# Altium schematic symbol library Regulator_Linear.SchLib: 1452 symbols (part 3 of 10)
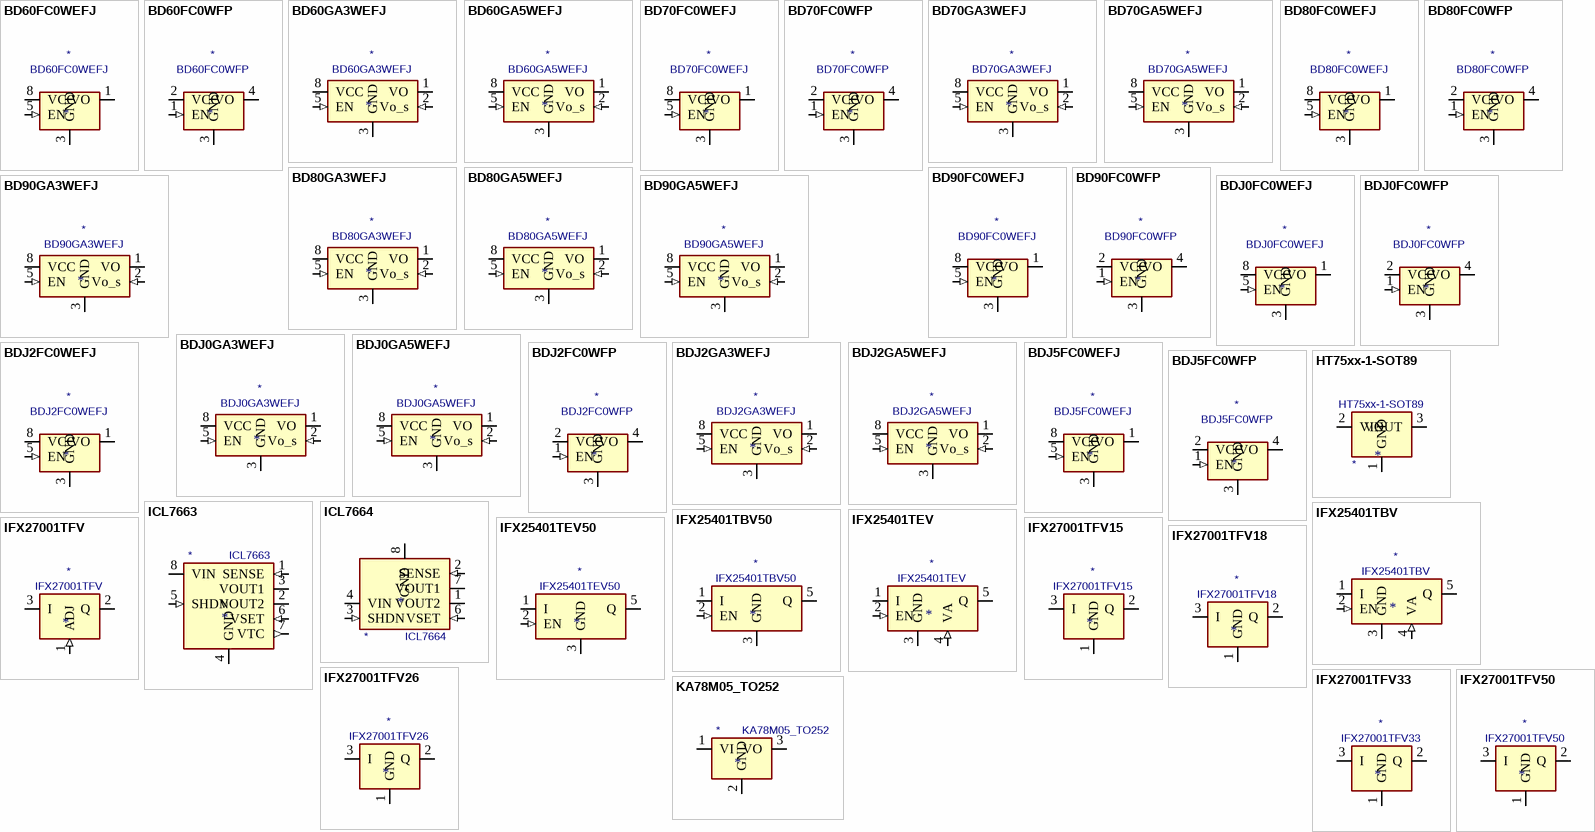
[diagram p38: symbols BD60FC0WEFJ to KA78M05_TO252]

## ICL7664
designator *  value ICL7664
ki_keywords: Linear Regulator 50mA -5V fixed negative; ki_description: 50mA Dual Mode -5V/Programmable Negative Voltage Regulator, DIP-8/SO-8/TO-99; ki_fp_filters: DIP*W7.62mm* SOIC*3.9x4.9mm*P1.27mm* TO?99*; Supplier: http://pe2bz.philpem.me.uk/pdf%20on%20typenumber/I-L/ICL7664.pdf
pins: 1 VOUT2 (power), 2 SENSE (in), 3 SHDN (in), 4 VIN (power), 5 SHDN (in) hidden, 6 VSET (in), 7 VOUT1 (power), 8 GND (power)

## IFX25401TBV
designator *  value IFX25401TBV
ki_keywords: adjustable LDO positive voltage regulator; ki_description: Adjustable LDO Linear Voltage Regulator (TO-263-5); ki_fp_filters: TO?263*TabPin3*; Footprint: Package_TO_SOT_SMD:TO-263-5_TabPin3; Supplier: https://www.infineon.com/dgdl/Infineon-IFX25401-DS-v01_02-en.pdf?fileId=db3a304320d39d590120f62a690569f7
footprint TO-263-5_TabPin3
pins: 1 I (power), 2 EN (in), 3 GND (power), 4 VA (in), 5 Q (power)

## IFX25401TBV50
designator *  value IFX25401TBV50
ki_keywords: fixed ldo positive voltage regulator; ki_description: Fixed 5V LDO Linear Voltage Regulator (TO-263-5); ki_fp_filters: TO?263*TabPin3*; Footprint: Package_TO_SOT_SMD:TO-263-5_TabPin3; Supplier: https://www.infineon.com/dgdl/Infineon-IFX25401-DS-v01_02-en.pdf?fileId=db3a304320d39d590120f62a690569f7
footprint TO-263-5_TabPin3
pins: 1 I (power), 2 EN (in), 3 GND (power), 4 NC (in) hidden, 5 Q (power)

## IFX25401TEV
designator *  value IFX25401TEV
ki_keywords: adjustable LDO positive voltage regulator; ki_description: Adjustable LDO Linear Voltage Regulator (TO-252-4); ki_fp_filters: TO*252*; Footprint: Package_TO_SOT_SMD:TO-252-4; Supplier: https://www.infineon.com/dgdl/Infineon-IFX25401-DS-v01_02-en.pdf?fileId=db3a304320d39d590120f62a690569f7
footprint TO-252-4
pins: 1 I (power), 2 EN (in), 3 GND (power), 4 VA (in), 5 Q (power)

## IFX25401TEV50
designator *  value IFX25401TEV50
ki_keywords: fixed ldo positive voltage regulator; ki_description: Fixed 5V LDO Linear Voltage Regulator (TO-252-4); ki_fp_filters: TO*252*; Footprint: Package_TO_SOT_SMD:TO-252-4; Supplier: https://www.infineon.com/dgdl/Infineon-IFX25401-DS-v01_02-en.pdf?fileId=db3a304320d39d590120f62a690569f7
footprint TO-252-4
pins: 1 I (power), 2 EN (in), 3 GND (power), 4 NC (in) hidden, 5 Q (power)

## IFX27001TFV
designator *  value IFX27001TFV
ki_keywords: LDO positive voltage industrial; ki_description: 1A Low Dropout Regulator, positive, adjustable output, TO-252-3; ki_fp_filters: TO?252*; Footprint: Package_TO_SOT_SMD:TO-252-3_TabPin2; Supplier: https://static6.arrow.com/aropdfconversion/dc75757ae45a88e5f69bdce3f2a651a5fe0ca07d/ifx27001_ds_10.pdf
footprint TO-252-3_TabPin2
pins: 1 ADJ (in), 2 Q (power), 3 I (power)

## IFX27001TFV15
designator *  value IFX27001TFV15
ki_keywords: LDO positive voltage industrial; ki_description: 1A Low Dropout Regulator, positive, 1.5V fixed output, TO-252-3; ki_fp_filters: TO?252*; Footprint: Package_TO_SOT_SMD:TO-252-3_TabPin2; Supplier: https://static6.arrow.com/aropdfconversion/dc75757ae45a88e5f69bdce3f2a651a5fe0ca07d/ifx27001_ds_10.pdf
footprint TO-252-3_TabPin2
pins: 1 GND (power), 2 Q (power), 3 I (power)

## IFX27001TFV18
designator *  value IFX27001TFV18
ki_keywords: LDO positive voltage industrial; ki_description: 1A Low Dropout Regulator, positive, 1.8V fixed output, TO-252-3; ki_fp_filters: TO?252*; Footprint: Package_TO_SOT_SMD:TO-252-3_TabPin2; Supplier: https://static6.arrow.com/aropdfconversion/dc75757ae45a88e5f69bdce3f2a651a5fe0ca07d/ifx27001_ds_10.pdf
footprint TO-252-3_TabPin2
pins: 1 GND (power), 2 Q (power), 3 I (power)

## IFX27001TFV26
designator *  value IFX27001TFV26
ki_keywords: LDO positive voltage industrial; ki_description: 1A Low Dropout Regulator, positive, 2.6V fixed output, TO-252-3; ki_fp_filters: TO?252*; Footprint: Package_TO_SOT_SMD:TO-252-3_TabPin2; Supplier: https://static6.arrow.com/aropdfconversion/dc75757ae45a88e5f69bdce3f2a651a5fe0ca07d/ifx27001_ds_10.pdf
footprint TO-252-3_TabPin2
pins: 1 GND (power), 2 Q (power), 3 I (power)

## IFX27001TFV33
designator *  value IFX27001TFV33
ki_keywords: LDO positive voltage industrial; ki_description: 1A Low Dropout Regulator, positive, 3.3V fixed output, TO-252-3; ki_fp_filters: TO?252*; Footprint: Package_TO_SOT_SMD:TO-252-3_TabPin2; Supplier: https://static6.arrow.com/aropdfconversion/dc75757ae45a88e5f69bdce3f2a651a5fe0ca07d/ifx27001_ds_10.pdf
footprint TO-252-3_TabPin2
pins: 1 GND (power), 2 Q (power), 3 I (power)

## IFX27001TFV50
designator *  value IFX27001TFV50
ki_keywords: LDO positive voltage industrial; ki_description: 1A Low Dropout Regulator, positive, 5.0V fixed output, TO-252-3; ki_fp_filters: TO?252*; Footprint: Package_TO_SOT_SMD:TO-252-3_TabPin2; Supplier: https://static6.arrow.com/aropdfconversion/dc75757ae45a88e5f69bdce3f2a651a5fe0ca07d/ifx27001_ds_10.pdf
footprint TO-252-3_TabPin2
pins: 1 GND (power), 2 Q (power), 3 I (power)

## KA78M05_TO252
designator *  value KA78M05_TO252
ki_keywords: Voltage Regulator 500mA Positive; ki_description: Positive 500mA 35V Linear Regulator, Fixed Output 5V, TO-252 (D-PAK); ki_fp_filters: TO?252*; Footprint: Package_TO_SOT_SMD:TO-252-2; Supplier: https://www.onsemi.com/pub/Collateral/MC78M00-D.PDF
footprint TO-252-2
pins: 1 VI (power), 2 GND (power), 3 VO (power)

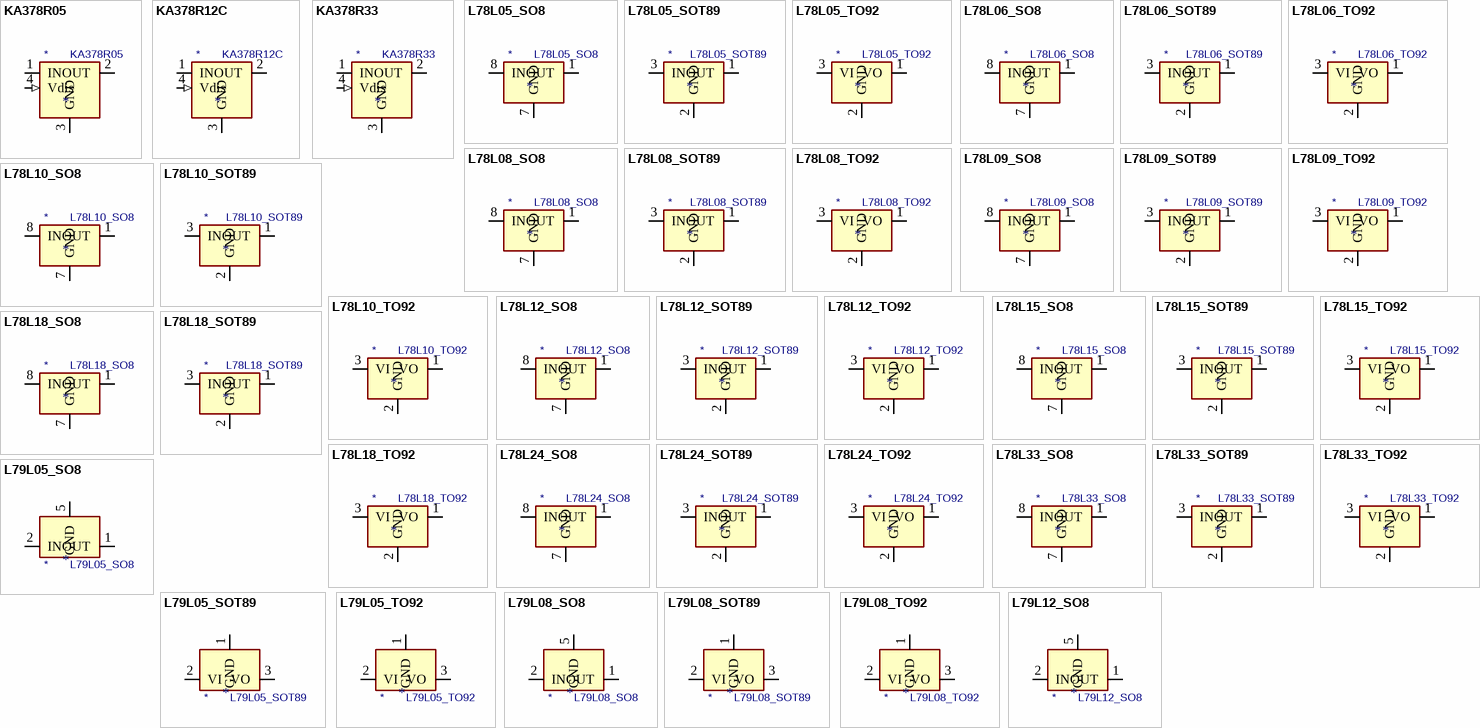
[diagram p8: symbols KA378R05 to L79L12_SO8]

## KA378R05
designator *  value KA378R05
ki_keywords: Voltage Regulator 3A Positive LDO Disable Pin; ki_description: Positive 3A 35V Linear Regulator with Disable Pin, LDO, Fixed Output 5V, TO-220F-4L; ki_fp_filters: TO?220*; Footprint: Package_TO_SOT_THT:TO-220-4_Vertical; Supplier: https://www.onsemi.com/pub/Collateral/KA378R05-D.pdf
footprint TO-220-4_Vertical
pins: 1 IN (power), 2 OUT (power), 3 GND (power), 4 Vdis (in)

## KA378R12C
designator *  value KA378R12C
ki_keywords: Voltage Regulator 3A Positive LDO Disable Pin; ki_description: Positive 3A 35V Linear Regulator with Disable Pin, LDO, Fixed Output 12V, TO-220F-4L; ki_fp_filters: TO?220*; Footprint: Package_TO_SOT_THT:TO-220-4_Vertical; Supplier: https://www.onsemi.com/pub/Collateral/KA378R12CTU-D.pdf
footprint TO-220-4_Vertical
pins: 1 IN (power), 2 OUT (power), 3 GND (power), 4 Vdis (in)

## KA378R33
designator *  value KA378R33
ki_keywords: Voltage Regulator 3A Positive LDO Disable Pin; ki_description: Positive 3A 35V Linear Regulator with Disable Pin, LDO, Fixed Output 3.3V, TO-220F-4L; ki_fp_filters: TO?220*; Footprint: Package_TO_SOT_THT:TO-220-4_Vertical; Supplier: https://www.onsemi.com/pub/Collateral/KA378R33-D.pdf
footprint TO-220-4_Vertical
pins: 1 IN (power), 2 OUT (power), 3 GND (power), 4 Vdis (in)

## L78L05_SO8
designator *  value L78L05_SO8
ki_keywords: Voltage Regulator 100mA Positive; ki_description: Positive 100mA 30V Linear Regulator, Fixed Output 5V, SO-8; ki_fp_filters: SOIC*3.9x4.9mm*P1.27mm*; Footprint: Package_SO:SOIC-8_3.9x4.9mm_P1.27mm; Supplier: http://www.st.com/content/ccc/resource/technical/document/datasheet/15/55/e5/aa/23/5b/43/fd/CD00000446.pdf/files/CD00000446.pdf/jcr:content/translations/en.CD00000446.pdf
footprint SOIC-8_3.9x4.9mm_P1.27mm
pins: 1 OUT (power), 2 GND hidden, 3 GND hidden, 4 NC (in) hidden, 5 NC (in) hidden, 6 GND hidden, 7 GND (power), 8 IN (power)

## L78L05_SOT89
designator *  value L78L05_SOT89
ki_keywords: Voltage Regulator 100mA Positive; ki_description: Positive 100mA 30V Linear Regulator, Fixed Output 5V, SOT-89; ki_fp_filters: SOT?89*; Footprint: Package_TO_SOT_SMD:SOT-89-3; Supplier: http://www.st.com/content/ccc/resource/technical/document/datasheet/15/55/e5/aa/23/5b/43/fd/CD00000446.pdf/files/CD00000446.pdf/jcr:content/translations/en.CD00000446.pdf
footprint SOT-89-3
pins: 1 OUT (power), 2 GND (power), 3 IN (power)

## L78L05_TO92
designator *  value L78L05_TO92
ki_keywords: Voltage Regulator 100mA Positive; ki_description: Positive 100mA 30V Linear Regulator, Fixed Output 5V, TO-92; ki_fp_filters: TO?92*; Footprint: Package_TO_SOT_THT:TO-92_Inline; Supplier: http://www.st.com/content/ccc/resource/technical/document/datasheet/15/55/e5/aa/23/5b/43/fd/CD00000446.pdf/files/CD00000446.pdf/jcr:content/translations/en.CD00000446.pdf
footprint TO-92_Inline
pins: 1 VO (power), 2 GND (power), 3 VI (power)

## L78L06_SO8
designator *  value L78L06_SO8
ki_keywords: Voltage Regulator 100mA Positive; ki_description: Positive 100mA 30V Linear Regulator, Fixed Output 6V, SO-8; ki_fp_filters: SOIC*3.9x4.9mm*P1.27mm*; Footprint: Package_SO:SOIC-8_3.9x4.9mm_P1.27mm; Supplier: http://www.st.com/content/ccc/resource/technical/document/datasheet/15/55/e5/aa/23/5b/43/fd/CD00000446.pdf/files/CD00000446.pdf/jcr:content/translations/en.CD00000446.pdf
footprint SOIC-8_3.9x4.9mm_P1.27mm
pins: 1 OUT (power), 2 GND hidden, 3 GND hidden, 4 NC (in) hidden, 5 NC (in) hidden, 6 GND hidden, 7 GND (power), 8 IN (power)

## L78L06_SOT89
designator *  value L78L06_SOT89
ki_keywords: Voltage Regulator 100mA Positive; ki_description: Positive 100mA 30V Linear Regulator, Fixed Output 6V, SOT-89; ki_fp_filters: SOT?89*; Footprint: Package_TO_SOT_SMD:SOT-89-3; Supplier: http://www.st.com/content/ccc/resource/technical/document/datasheet/15/55/e5/aa/23/5b/43/fd/CD00000446.pdf/files/CD00000446.pdf/jcr:content/translations/en.CD00000446.pdf
footprint SOT-89-3
pins: 1 OUT (power), 2 GND (power), 3 IN (power)

## L78L06_TO92
designator *  value L78L06_TO92
ki_keywords: Voltage Regulator 100mA Positive; ki_description: Positive 100mA 30V Linear Regulator, Fixed Output 6V, TO-92; ki_fp_filters: TO?92*; Footprint: Package_TO_SOT_THT:TO-92_Inline; Supplier: http://www.st.com/content/ccc/resource/technical/document/datasheet/15/55/e5/aa/23/5b/43/fd/CD00000446.pdf/files/CD00000446.pdf/jcr:content/translations/en.CD00000446.pdf
footprint TO-92_Inline
pins: 1 VO (power), 2 GND (power), 3 VI (power)

## L78L08_SO8
designator *  value L78L08_SO8
ki_keywords: Voltage Regulator 100mA Positive; ki_description: Positive 100mA 30V Linear Regulator, Fixed Output 8V, SO-8; ki_fp_filters: SOIC*3.9x4.9mm*P1.27mm*; Footprint: Package_SO:SOIC-8_3.9x4.9mm_P1.27mm; Supplier: http://www.st.com/content/ccc/resource/technical/document/datasheet/15/55/e5/aa/23/5b/43/fd/CD00000446.pdf/files/CD00000446.pdf/jcr:content/translations/en.CD00000446.pdf
footprint SOIC-8_3.9x4.9mm_P1.27mm
pins: 1 OUT (power), 2 GND hidden, 3 GND hidden, 4 NC (in) hidden, 5 NC (in) hidden, 6 GND hidden, 7 GND (power), 8 IN (power)

## L78L08_SOT89
designator *  value L78L08_SOT89
ki_keywords: Voltage Regulator 100mA Positive; ki_description: Positive 100mA 30V Linear Regulator, Fixed Output 8V, SOT-89; ki_fp_filters: SOT?89*; Footprint: Package_TO_SOT_SMD:SOT-89-3; Supplier: http://www.st.com/content/ccc/resource/technical/document/datasheet/15/55/e5/aa/23/5b/43/fd/CD00000446.pdf/files/CD00000446.pdf/jcr:content/translations/en.CD00000446.pdf
footprint SOT-89-3
pins: 1 OUT (power), 2 GND (power), 3 IN (power)

## L78L08_TO92
designator *  value L78L08_TO92
ki_keywords: Voltage Regulator 100mA Positive; ki_description: Positive 100mA 30V Linear Regulator, Fixed Output 8V, TO-92; ki_fp_filters: TO?92*; Footprint: Package_TO_SOT_THT:TO-92_Inline; Supplier: http://www.st.com/content/ccc/resource/technical/document/datasheet/15/55/e5/aa/23/5b/43/fd/CD00000446.pdf/files/CD00000446.pdf/jcr:content/translations/en.CD00000446.pdf
footprint TO-92_Inline
pins: 1 VO (power), 2 GND (power), 3 VI (power)

## L78L09_SO8
designator *  value L78L09_SO8
ki_keywords: Voltage Regulator 100mA Positive; ki_description: Positive 100mA 30V Linear Regulator, Fixed Output 9V, SO-8; ki_fp_filters: SOIC*3.9x4.9mm*P1.27mm*; Footprint: Package_SO:SOIC-8_3.9x4.9mm_P1.27mm; Supplier: http://www.st.com/content/ccc/resource/technical/document/datasheet/15/55/e5/aa/23/5b/43/fd/CD00000446.pdf/files/CD00000446.pdf/jcr:content/translations/en.CD00000446.pdf
footprint SOIC-8_3.9x4.9mm_P1.27mm
pins: 1 OUT (power), 2 GND hidden, 3 GND hidden, 4 NC (in) hidden, 5 NC (in) hidden, 6 GND hidden, 7 GND (power), 8 IN (power)

## L78L09_SOT89
designator *  value L78L09_SOT89
ki_keywords: Voltage Regulator 100mA Positive; ki_description: Positive 100mA 30V Linear Regulator, Fixed Output 9V, SOT-89; ki_fp_filters: SOT?89*; Footprint: Package_TO_SOT_SMD:SOT-89-3; Supplier: http://www.st.com/content/ccc/resource/technical/document/datasheet/15/55/e5/aa/23/5b/43/fd/CD00000446.pdf/files/CD00000446.pdf/jcr:content/translations/en.CD00000446.pdf
footprint SOT-89-3
pins: 1 OUT (power), 2 GND (power), 3 IN (power)

## L78L09_TO92
designator *  value L78L09_TO92
ki_keywords: Voltage Regulator 100mA Positive; ki_description: Positive 100mA 30V Linear Regulator, Fixed Output 9V, TO-92; ki_fp_filters: TO?92*; Footprint: Package_TO_SOT_THT:TO-92_Inline; Supplier: http://www.st.com/content/ccc/resource/technical/document/datasheet/15/55/e5/aa/23/5b/43/fd/CD00000446.pdf/files/CD00000446.pdf/jcr:content/translations/en.CD00000446.pdf
footprint TO-92_Inline
pins: 1 VO (power), 2 GND (power), 3 VI (power)

## L78L10_SO8
designator *  value L78L10_SO8
ki_keywords: Voltage Regulator 100mA Positive; ki_description: Positive 100mA 30V Linear Regulator, Fixed Output 10V, SO-8; ki_fp_filters: SOIC*3.9x4.9mm*P1.27mm*; Footprint: Package_SO:SOIC-8_3.9x4.9mm_P1.27mm; Supplier: http://www.st.com/content/ccc/resource/technical/document/datasheet/15/55/e5/aa/23/5b/43/fd/CD00000446.pdf/files/CD00000446.pdf/jcr:content/translations/en.CD00000446.pdf
footprint SOIC-8_3.9x4.9mm_P1.27mm
pins: 1 OUT (power), 2 GND hidden, 3 GND hidden, 4 NC (in) hidden, 5 NC (in) hidden, 6 GND hidden, 7 GND (power), 8 IN (power)

## L78L10_SOT89
designator *  value L78L10_SOT89
ki_keywords: Voltage Regulator 100mA Positive; ki_description: Positive 100mA 30V Linear Regulator, Fixed Output 10V, SOT-89; ki_fp_filters: SOT?89*; Footprint: Package_TO_SOT_SMD:SOT-89-3; Supplier: http://www.st.com/content/ccc/resource/technical/document/datasheet/15/55/e5/aa/23/5b/43/fd/CD00000446.pdf/files/CD00000446.pdf/jcr:content/translations/en.CD00000446.pdf
footprint SOT-89-3
pins: 1 OUT (power), 2 GND (power), 3 IN (power)

## L78L10_TO92
designator *  value L78L10_TO92
ki_keywords: Voltage Regulator 100mA Positive; ki_description: Positive 100mA 30V Linear Regulator, Fixed Output 10V, TO-92; ki_fp_filters: TO?92*; Footprint: Package_TO_SOT_THT:TO-92_Inline; Supplier: http://www.st.com/content/ccc/resource/technical/document/datasheet/15/55/e5/aa/23/5b/43/fd/CD00000446.pdf/files/CD00000446.pdf/jcr:content/translations/en.CD00000446.pdf
footprint TO-92_Inline
pins: 1 VO (power), 2 GND (power), 3 VI (power)

## L78L12_SO8
designator *  value L78L12_SO8
ki_keywords: Voltage Regulator 100mA Positive; ki_description: Positive 100mA 30V Linear Regulator, Fixed Output 12V, SO-8; ki_fp_filters: SOIC*3.9x4.9mm*P1.27mm*; Footprint: Package_SO:SOIC-8_3.9x4.9mm_P1.27mm; Supplier: http://www.st.com/content/ccc/resource/technical/document/datasheet/15/55/e5/aa/23/5b/43/fd/CD00000446.pdf/files/CD00000446.pdf/jcr:content/translations/en.CD00000446.pdf
footprint SOIC-8_3.9x4.9mm_P1.27mm
pins: 1 OUT (power), 2 GND hidden, 3 GND hidden, 4 NC (in) hidden, 5 NC (in) hidden, 6 GND hidden, 7 GND (power), 8 IN (power)

## L78L12_SOT89
designator *  value L78L12_SOT89
ki_keywords: Voltage Regulator 100mA Positive; ki_description: Positive 100mA 30V Linear Regulator, Fixed Output 12V, SOT-89; ki_fp_filters: SOT?89*; Footprint: Package_TO_SOT_SMD:SOT-89-3; Supplier: http://www.st.com/content/ccc/resource/technical/document/datasheet/15/55/e5/aa/23/5b/43/fd/CD00000446.pdf/files/CD00000446.pdf/jcr:content/translations/en.CD00000446.pdf
footprint SOT-89-3
pins: 1 OUT (power), 2 GND (power), 3 IN (power)

## L78L12_TO92
designator *  value L78L12_TO92
ki_keywords: Voltage Regulator 100mA Positive; ki_description: Positive 100mA 30V Linear Regulator, Fixed Output 12V, TO-92; ki_fp_filters: TO?92*; Footprint: Package_TO_SOT_THT:TO-92_Inline; Supplier: http://www.st.com/content/ccc/resource/technical/document/datasheet/15/55/e5/aa/23/5b/43/fd/CD00000446.pdf/files/CD00000446.pdf/jcr:content/translations/en.CD00000446.pdf
footprint TO-92_Inline
pins: 1 VO (power), 2 GND (power), 3 VI (power)

## L78L15_SO8
designator *  value L78L15_SO8
ki_keywords: Voltage Regulator 100mA Positive; ki_description: Positive 100mA 30V Linear Regulator, Fixed Output 15V, SO-8; ki_fp_filters: SOIC*3.9x4.9mm*P1.27mm*; Footprint: Package_SO:SOIC-8_3.9x4.9mm_P1.27mm; Supplier: http://www.st.com/content/ccc/resource/technical/document/datasheet/15/55/e5/aa/23/5b/43/fd/CD00000446.pdf/files/CD00000446.pdf/jcr:content/translations/en.CD00000446.pdf
footprint SOIC-8_3.9x4.9mm_P1.27mm
pins: 1 OUT (power), 2 GND hidden, 3 GND hidden, 4 NC (in) hidden, 5 NC (in) hidden, 6 GND hidden, 7 GND (power), 8 IN (power)

## L78L15_SOT89
designator *  value L78L15_SOT89
ki_keywords: Voltage Regulator 100mA Positive; ki_description: Positive 100mA 30V Linear Regulator, Fixed Output 15V, SOT-89; ki_fp_filters: SOT?89*; Footprint: Package_TO_SOT_SMD:SOT-89-3; Supplier: http://www.st.com/content/ccc/resource/technical/document/datasheet/15/55/e5/aa/23/5b/43/fd/CD00000446.pdf/files/CD00000446.pdf/jcr:content/translations/en.CD00000446.pdf
footprint SOT-89-3
pins: 1 OUT (power), 2 GND (power), 3 IN (power)

## L78L15_TO92
designator *  value L78L15_TO92
ki_keywords: Voltage Regulator 100mA Positive; ki_description: Positive 100mA 30V Linear Regulator, Fixed Output 15V, TO-92; ki_fp_filters: TO?92*; Footprint: Package_TO_SOT_THT:TO-92_Inline; Supplier: http://www.st.com/content/ccc/resource/technical/document/datasheet/15/55/e5/aa/23/5b/43/fd/CD00000446.pdf/files/CD00000446.pdf/jcr:content/translations/en.CD00000446.pdf
footprint TO-92_Inline
pins: 1 VO (power), 2 GND (power), 3 VI (power)

## L78L18_SO8
designator *  value L78L18_SO8
ki_keywords: Voltage Regulator 100mA Positive; ki_description: Positive 100mA 30V Linear Regulator, Fixed Output 18V, SO-8; ki_fp_filters: SOIC*3.9x4.9mm*P1.27mm*; Footprint: Package_SO:SOIC-8_3.9x4.9mm_P1.27mm; Supplier: http://www.st.com/content/ccc/resource/technical/document/datasheet/15/55/e5/aa/23/5b/43/fd/CD00000446.pdf/files/CD00000446.pdf/jcr:content/translations/en.CD00000446.pdf
footprint SOIC-8_3.9x4.9mm_P1.27mm
pins: 1 OUT (power), 2 GND hidden, 3 GND hidden, 4 NC (in) hidden, 5 NC (in) hidden, 6 GND hidden, 7 GND (power), 8 IN (power)

## L78L18_SOT89
designator *  value L78L18_SOT89
ki_keywords: Voltage Regulator 100mA Positive; ki_description: Positive 100mA 30V Linear Regulator, Fixed Output 18V, SOT-89; ki_fp_filters: SOT?89*; Footprint: Package_TO_SOT_SMD:SOT-89-3; Supplier: http://www.st.com/content/ccc/resource/technical/document/datasheet/15/55/e5/aa/23/5b/43/fd/CD00000446.pdf/files/CD00000446.pdf/jcr:content/translations/en.CD00000446.pdf
footprint SOT-89-3
pins: 1 OUT (power), 2 GND (power), 3 IN (power)

## L78L18_TO92
designator *  value L78L18_TO92
ki_keywords: Voltage Regulator 100mA Positive; ki_description: Positive 100mA 30V Linear Regulator, Fixed Output 18V, TO-92; ki_fp_filters: TO?92*; Footprint: Package_TO_SOT_THT:TO-92_Inline; Supplier: http://www.st.com/content/ccc/resource/technical/document/datasheet/15/55/e5/aa/23/5b/43/fd/CD00000446.pdf/files/CD00000446.pdf/jcr:content/translations/en.CD00000446.pdf
footprint TO-92_Inline
pins: 1 VO (power), 2 GND (power), 3 VI (power)

## L78L24_SO8
designator *  value L78L24_SO8
ki_keywords: Voltage Regulator 100mA Positive; ki_description: Positive 100mA 30V Linear Regulator, Fixed Output 24V, SO-8; ki_fp_filters: SOIC*3.9x4.9mm*P1.27mm*; Footprint: Package_SO:SOIC-8_3.9x4.9mm_P1.27mm; Supplier: http://www.st.com/content/ccc/resource/technical/document/datasheet/15/55/e5/aa/23/5b/43/fd/CD00000446.pdf/files/CD00000446.pdf/jcr:content/translations/en.CD00000446.pdf
footprint SOIC-8_3.9x4.9mm_P1.27mm
pins: 1 OUT (power), 2 GND hidden, 3 GND hidden, 4 NC (in) hidden, 5 NC (in) hidden, 6 GND hidden, 7 GND (power), 8 IN (power)

## L78L24_SOT89
designator *  value L78L24_SOT89
ki_keywords: Voltage Regulator 100mA Positive; ki_description: Positive 100mA 30V Linear Regulator, Fixed Output 24V, SOT-89; ki_fp_filters: SOT?89*; Footprint: Package_TO_SOT_SMD:SOT-89-3; Supplier: http://www.st.com/content/ccc/resource/technical/document/datasheet/15/55/e5/aa/23/5b/43/fd/CD00000446.pdf/files/CD00000446.pdf/jcr:content/translations/en.CD00000446.pdf
footprint SOT-89-3
pins: 1 OUT (power), 2 GND (power), 3 IN (power)

## L78L24_TO92
designator *  value L78L24_TO92
ki_keywords: Voltage Regulator 100mA Positive; ki_description: Positive 100mA 30V Linear Regulator, Fixed Output 24V, TO-92; ki_fp_filters: TO?92*; Footprint: Package_TO_SOT_THT:TO-92_Inline; Supplier: http://www.st.com/content/ccc/resource/technical/document/datasheet/15/55/e5/aa/23/5b/43/fd/CD00000446.pdf/files/CD00000446.pdf/jcr:content/translations/en.CD00000446.pdf
footprint TO-92_Inline
pins: 1 VO (power), 2 GND (power), 3 VI (power)

## L78L33_SO8
designator *  value L78L33_SO8
ki_keywords: Voltage Regulator 100mA Positive; ki_description: Positive 100mA 30V Linear Regulator, Fixed Output 3.3V, SO-8; ki_fp_filters: SOIC*3.9x4.9mm*P1.27mm*; Footprint: Package_SO:SOIC-8_3.9x4.9mm_P1.27mm; Supplier: http://www.st.com/content/ccc/resource/technical/document/datasheet/15/55/e5/aa/23/5b/43/fd/CD00000446.pdf/files/CD00000446.pdf/jcr:content/translations/en.CD00000446.pdf
footprint SOIC-8_3.9x4.9mm_P1.27mm
pins: 1 OUT (power), 2 GND hidden, 3 GND hidden, 4 NC (in) hidden, 5 NC (in) hidden, 6 GND hidden, 7 GND (power), 8 IN (power)

## L78L33_SOT89
designator *  value L78L33_SOT89
ki_keywords: Voltage Regulator 100mA Positive; ki_description: Positive 100mA 30V Linear Regulator, Fixed Output 3.3V, SOT-89; ki_fp_filters: SOT?89*; Footprint: Package_TO_SOT_SMD:SOT-89-3; Supplier: http://www.st.com/content/ccc/resource/technical/document/datasheet/15/55/e5/aa/23/5b/43/fd/CD00000446.pdf/files/CD00000446.pdf/jcr:content/translations/en.CD00000446.pdf
footprint SOT-89-3
pins: 1 OUT (power), 2 GND (power), 3 IN (power)

## L78L33_TO92
designator *  value L78L33_TO92
ki_keywords: Voltage Regulator 100mA Positive; ki_description: Positive 100mA 30V Linear Regulator, Fixed Output 3.3V, TO-92; ki_fp_filters: TO?92*; Footprint: Package_TO_SOT_THT:TO-92_Inline; Supplier: http://www.st.com/content/ccc/resource/technical/document/datasheet/15/55/e5/aa/23/5b/43/fd/CD00000446.pdf/files/CD00000446.pdf/jcr:content/translations/en.CD00000446.pdf
footprint TO-92_Inline
pins: 1 VO (power), 2 GND (power), 3 VI (power)

## L79L05_SO8
designator *  value L79L05_SO8
ki_keywords: Voltage Regulator 100mA Negative; ki_description: Negative 100mA -30V Linear Regulator, Fixed Output -5V, SO-8; ki_fp_filters: SOIC?8*3.9x4.9mm*P1.27mm*; Footprint: Package_SO:SOIC-8_3.9x4.9mm_P1.27mm; Supplier: http://www.farnell.com/datasheets/1827870.pdf
footprint SOIC-8_3.9x4.9mm_P1.27mm
pins: 1 OUT (power), 2 IN (power), 3 IN hidden, 4 NC (in) hidden, 5 GND (power), 6 IN hidden, 7 IN hidden, 8 NC (in) hidden

## L79L05_SOT89
designator *  value L79L05_SOT89
ki_keywords: Voltage Regulator 100mA Negative; ki_description: Negative 100mA -30V Linear Regulator, Fixed Output -5V, SOT-89; ki_fp_filters: SOT?89*; Footprint: Package_TO_SOT_SMD:SOT-89-3; Supplier: http://www.farnell.com/datasheets/1827870.pdf
footprint SOT-89-3
pins: 1 GND (power), 2 VI (power), 3 VO (power)

## L79L05_TO92
designator *  value L79L05_TO92
ki_keywords: Voltage Regulator 100mA Negative; ki_description: Negative 100mA -30V Linear Regulator, Fixed Output -5V, TO-92; ki_fp_filters: TO?92*; Footprint: Package_TO_SOT_THT:TO-92_Inline; Supplier: http://www.farnell.com/datasheets/1827870.pdf
footprint TO-92_Inline
pins: 1 GND (power), 2 VI (power), 3 VO (power)

## L79L08_SO8
designator *  value L79L08_SO8
ki_keywords: Voltage Regulator 100mA Negative; ki_description: Negative 100mA -30V Linear Regulator, Fixed Output -5V, SO-8; ki_fp_filters: SOIC?8*3.9x4.9mm*P1.27mm*; Footprint: Package_SO:SOIC-8_3.9x4.9mm_P1.27mm; Supplier: http://www.farnell.com/datasheets/1827870.pdf
footprint SOIC-8_3.9x4.9mm_P1.27mm
pins: 1 OUT (power), 2 IN (power), 3 IN hidden, 4 NC (in) hidden, 5 GND (power), 6 IN hidden, 7 IN hidden, 8 NC (in) hidden

## L79L08_SOT89
designator *  value L79L08_SOT89
ki_keywords: Voltage Regulator 100mA Negative; ki_description: Negative 100mA -30V Linear Regulator, Fixed Output -5V, SOT-89; ki_fp_filters: SOT?89*; Footprint: Package_TO_SOT_SMD:SOT-89-3; Supplier: http://www.farnell.com/datasheets/1827870.pdf
footprint SOT-89-3
pins: 1 GND (power), 2 VI (power), 3 VO (power)

## L79L08_TO92
designator *  value L79L08_TO92
ki_keywords: Voltage Regulator 100mA Negative; ki_description: Negative 100mA -30V Linear Regulator, Fixed Output -5V, TO-92; ki_fp_filters: TO?92*; Footprint: Package_TO_SOT_THT:TO-92_Inline; Supplier: http://www.farnell.com/datasheets/1827870.pdf
footprint TO-92_Inline
pins: 1 GND (power), 2 VI (power), 3 VO (power)

## L79L12_SO8
designator *  value L79L12_SO8
ki_keywords: Voltage Regulator 100mA Negative; ki_description: Negative 100mA -30V Linear Regulator, Fixed Output -5V, SO-8; ki_fp_filters: SOIC?8*3.9x4.9mm*P1.27mm*; Footprint: Package_SO:SOIC-8_3.9x4.9mm_P1.27mm; Supplier: http://www.farnell.com/datasheets/1827870.pdf
footprint SOIC-8_3.9x4.9mm_P1.27mm
pins: 1 OUT (power), 2 IN (power), 3 IN hidden, 4 NC (in) hidden, 5 GND (power), 6 IN hidden, 7 IN hidden, 8 NC (in) hidden

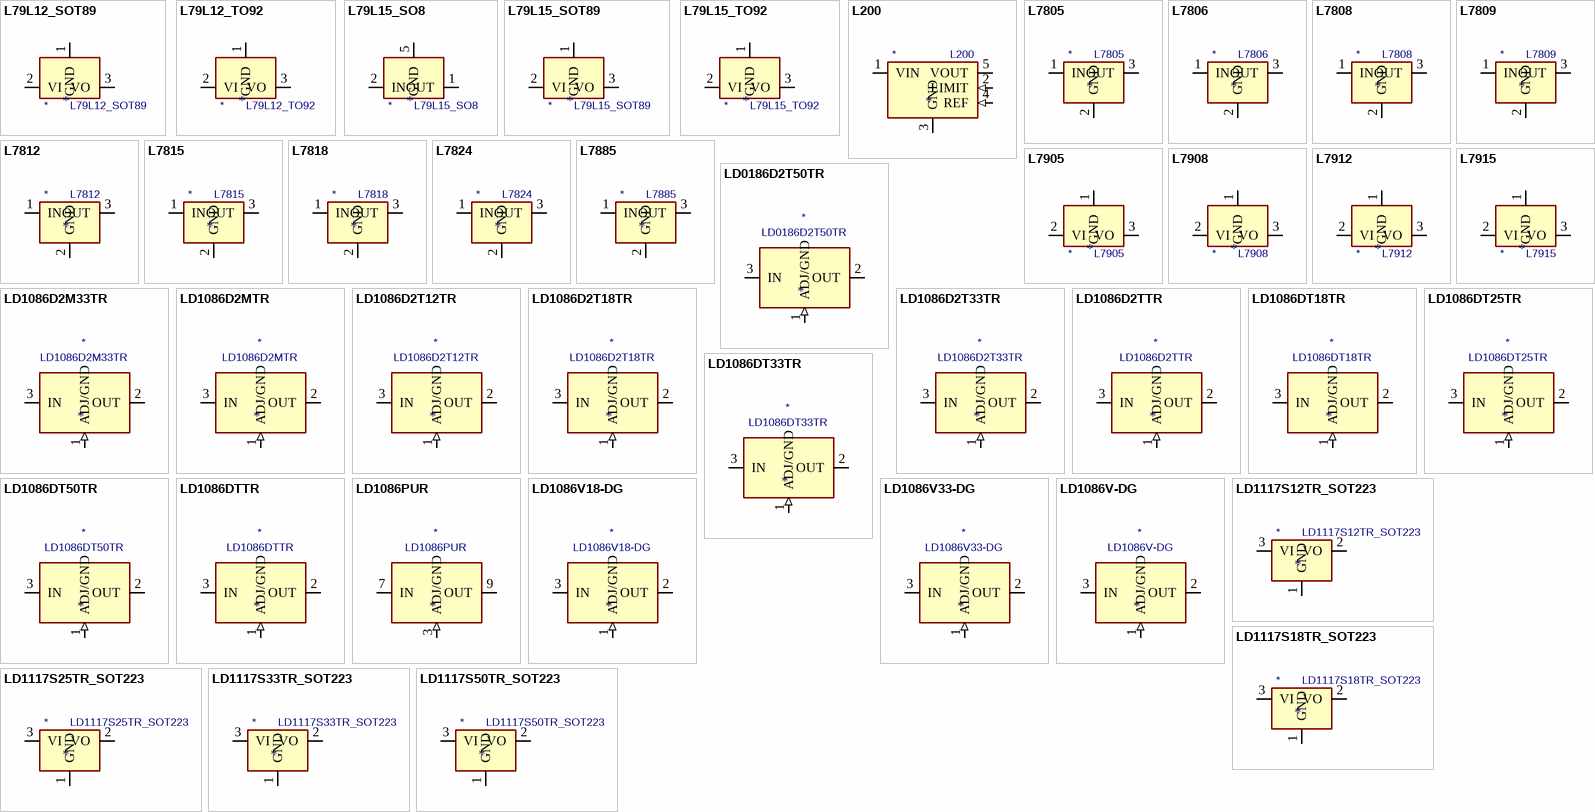
[diagram p9: symbols L79L12_SOT89 to LD1117S50TR_SOT223]

## L79L12_SOT89
designator *  value L79L12_SOT89
ki_keywords: Voltage Regulator 100mA Negative; ki_description: Negative 100mA -30V Linear Regulator, Fixed Output -5V, SOT-89; ki_fp_filters: SOT?89*; Footprint: Package_TO_SOT_SMD:SOT-89-3; Supplier: http://www.farnell.com/datasheets/1827870.pdf
footprint SOT-89-3
pins: 1 GND (power), 2 VI (power), 3 VO (power)

## L79L12_TO92
designator *  value L79L12_TO92
ki_keywords: Voltage Regulator 100mA Negative; ki_description: Negative 100mA -30V Linear Regulator, Fixed Output -5V, TO-92; ki_fp_filters: TO?92*; Footprint: Package_TO_SOT_THT:TO-92_Inline; Supplier: http://www.farnell.com/datasheets/1827870.pdf
footprint TO-92_Inline
pins: 1 GND (power), 2 VI (power), 3 VO (power)

## L79L15_SO8
designator *  value L79L15_SO8
ki_keywords: Voltage Regulator 100mA Negative; ki_description: Negative 100mA -30V Linear Regulator, Fixed Output -5V, SO-8; ki_fp_filters: SOIC?8*3.9x4.9mm*P1.27mm*; Footprint: Package_SO:SOIC-8_3.9x4.9mm_P1.27mm; Supplier: http://www.farnell.com/datasheets/1827870.pdf
footprint SOIC-8_3.9x4.9mm_P1.27mm
pins: 1 OUT (power), 2 IN (power), 3 IN hidden, 4 NC (in) hidden, 5 GND (power), 6 IN hidden, 7 IN hidden, 8 NC (in) hidden

## L79L15_SOT89
designator *  value L79L15_SOT89
ki_keywords: Voltage Regulator 100mA Negative; ki_description: Negative 100mA -30V Linear Regulator, Fixed Output -5V, SOT-89; ki_fp_filters: SOT?89*; Footprint: Package_TO_SOT_SMD:SOT-89-3; Supplier: http://www.farnell.com/datasheets/1827870.pdf
footprint SOT-89-3
pins: 1 GND (power), 2 VI (power), 3 VO (power)

## L79L15_TO92
designator *  value L79L15_TO92
ki_keywords: Voltage Regulator 100mA Negative; ki_description: Negative 100mA -30V Linear Regulator, Fixed Output -5V, TO-92; ki_fp_filters: TO?92*; Footprint: Package_TO_SOT_THT:TO-92_Inline; Supplier: http://www.farnell.com/datasheets/1827870.pdf
footprint TO-92_Inline
pins: 1 GND (power), 2 VI (power), 3 VO (power)

## L200
designator *  value L200
ki_keywords: 2A Regulator Adjustable Positive; ki_description: Adjustable voltage and current regulator, 2A, 36V; ki_fp_filters: TO?220*StaggerOdd*; Footprint: Package_TO_SOT_THT:TO-220-5_P3.4x3.8mm_StaggerOdd_Lead7.13mm_TabDown; Supplier: http://www.zen22142.zen.co.uk/Circuits/Power/l200.pdf
footprint TO-220-5_P3.4x3.8mm_StaggerOdd_Lead7.13mm_TabDown
pins: 1 VIN (power), 2 LIMIT (in), 3 GND (power), 4 REF (in), 5 VOUT (power)

## L7805
designator *  value L7805
ki_keywords: Voltage Regulator 1.5A Positive; ki_description: Positive 1.5A 35V Linear Regulator, Fixed Output 5V, TO-220/TO-263/TO-252; ki_fp_filters: TO?252* TO?263* TO?220*; Supplier: http://www.st.com/content/ccc/resource/technical/document/datasheet/41/4f/b3/b0/12/d4/47/88/CD00000444.pdf/files/CD00000444.pdf/jcr:content/translations/en.CD00000444.pdf
pins: 1 IN (power), 2 GND (power), 3 OUT (power)

## L7806
designator *  value L7806
ki_keywords: Voltage Regulator 1.5A Positive; ki_description: Positive 1.5A 35V Linear Regulator, Fixed Output 6V, TO-220/TO-263/TO-252; ki_fp_filters: TO?252* TO?263* TO?220*; Supplier: http://www.st.com/content/ccc/resource/technical/document/datasheet/41/4f/b3/b0/12/d4/47/88/CD00000444.pdf/files/CD00000444.pdf/jcr:content/translations/en.CD00000444.pdf
pins: 1 IN (power), 2 GND (power), 3 OUT (power)

## L7808
designator *  value L7808
ki_keywords: Voltage Regulator 1.5A Positive; ki_description: Positive 1.5A 35V Linear Regulator, Fixed Output 8V, TO-220/TO-263/TO-252; ki_fp_filters: TO?252* TO?263* TO?220*; Supplier: http://www.st.com/content/ccc/resource/technical/document/datasheet/41/4f/b3/b0/12/d4/47/88/CD00000444.pdf/files/CD00000444.pdf/jcr:content/translations/en.CD00000444.pdf
pins: 1 IN (power), 2 GND (power), 3 OUT (power)

## L7809
designator *  value L7809
ki_keywords: Voltage Regulator 1.5A Positive; ki_description: Positive 1.5A 35V Linear Regulator, Fixed Output 9V, TO-220/TO-263/TO-252; ki_fp_filters: TO?252* TO?263* TO?220*; Supplier: http://www.st.com/content/ccc/resource/technical/document/datasheet/41/4f/b3/b0/12/d4/47/88/CD00000444.pdf/files/CD00000444.pdf/jcr:content/translations/en.CD00000444.pdf
pins: 1 IN (power), 2 GND (power), 3 OUT (power)

## L7812
designator *  value L7812
ki_keywords: Voltage Regulator 1.5A Positive; ki_description: Positive 1.5A 35V Linear Regulator, Fixed Output 12V, TO-220/TO-263/TO-252; ki_fp_filters: TO?252* TO?263* TO?220*; Supplier: http://www.st.com/content/ccc/resource/technical/document/datasheet/41/4f/b3/b0/12/d4/47/88/CD00000444.pdf/files/CD00000444.pdf/jcr:content/translations/en.CD00000444.pdf
pins: 1 IN (power), 2 GND (power), 3 OUT (power)

## L7815
designator *  value L7815
ki_keywords: Voltage Regulator 1.5A Positive; ki_description: Positive 1.5A 35V Linear Regulator, Fixed Output 15V, TO-220/TO-263/TO-252; ki_fp_filters: TO?252* TO?263* TO?220*; Supplier: http://www.st.com/content/ccc/resource/technical/document/datasheet/41/4f/b3/b0/12/d4/47/88/CD00000444.pdf/files/CD00000444.pdf/jcr:content/translations/en.CD00000444.pdf
pins: 1 IN (power), 2 GND (power), 3 OUT (power)

## L7818
designator *  value L7818
ki_keywords: Voltage Regulator 1.5A Positive; ki_description: Positive 1.5A 35V Linear Regulator, Fixed Output 18V, TO-220/TO-263/TO-252; ki_fp_filters: TO?252* TO?263* TO?220*; Supplier: http://www.st.com/content/ccc/resource/technical/document/datasheet/41/4f/b3/b0/12/d4/47/88/CD00000444.pdf/files/CD00000444.pdf/jcr:content/translations/en.CD00000444.pdf
pins: 1 IN (power), 2 GND (power), 3 OUT (power)

## L7824
designator *  value L7824
ki_keywords: Voltage Regulator 1.5A Positive; ki_description: Positive 1.5A 40V Linear Regulator, Fixed Output 24V, TO-220/TO-263/TO-252; ki_fp_filters: TO?252* TO?263* TO?220*; Supplier: http://www.st.com/content/ccc/resource/technical/document/datasheet/41/4f/b3/b0/12/d4/47/88/CD00000444.pdf/files/CD00000444.pdf/jcr:content/translations/en.CD00000444.pdf
pins: 1 IN (power), 2 GND (power), 3 OUT (power)

## L7885
designator *  value L7885
ki_keywords: Voltage Regulator 1.5A Positive; ki_description: Positive 1.5A 35V Linear Regulator, Fixed Output 8.5V, TO-220/TO-263/TO-252; ki_fp_filters: TO?252* TO?263* TO?220*; Supplier: http://www.st.com/content/ccc/resource/technical/document/datasheet/41/4f/b3/b0/12/d4/47/88/CD00000444.pdf/files/CD00000444.pdf/jcr:content/translations/en.CD00000444.pdf
pins: 1 IN (power), 2 GND (power), 3 OUT (power)

## L7905
designator *  value L7905
ki_keywords: Voltage Regulator 1.5A Negative; ki_description: Negative 1.5A 35V Linear Regulator, Fixed Output -5V, TO-220/TO-263; ki_fp_filters: TO?220* TO?263*; Supplier: http://www.st.com/content/ccc/resource/technical/document/datasheet/c9/16/86/41/c7/2b/45/f2/CD00000450.pdf/files/CD00000450.pdf/jcr:content/translations/en.CD00000450.pdf
pins: 1 GND (power), 2 VI (power), 3 VO (power)

## L7908
designator *  value L7908
ki_keywords: Voltage Regulator 1.5A Negative; ki_description: Negative 1.5A 35V Linear Regulator, Fixed Output -8V, TO-220/TO-263; ki_fp_filters: TO?220* TO?263*; Supplier: http://www.st.com/content/ccc/resource/technical/document/datasheet/c9/16/86/41/c7/2b/45/f2/CD00000450.pdf/files/CD00000450.pdf/jcr:content/translations/en.CD00000450.pdf
pins: 1 GND (power), 2 VI (power), 3 VO (power)

## L7912
designator *  value L7912
ki_keywords: Voltage Regulator 1.5A Negative; ki_description: Negative 1.5A 35V Linear Regulator, Fixed Output -12V, TO-220/TO-263; ki_fp_filters: TO?220* TO?263*; Supplier: http://www.st.com/content/ccc/resource/technical/document/datasheet/c9/16/86/41/c7/2b/45/f2/CD00000450.pdf/files/CD00000450.pdf/jcr:content/translations/en.CD00000450.pdf
pins: 1 GND (power), 2 VI (power), 3 VO (power)

## L7915
designator *  value L7915
ki_keywords: Voltage Regulator 1.5A Negative; ki_description: Negative 1.5A 35V Linear Regulator, Fixed Output -15V, TO-220/TO-263; ki_fp_filters: TO?220* TO?263*; Supplier: http://www.st.com/content/ccc/resource/technical/document/datasheet/c9/16/86/41/c7/2b/45/f2/CD00000450.pdf/files/CD00000450.pdf/jcr:content/translations/en.CD00000450.pdf
pins: 1 GND (power), 2 VI (power), 3 VO (power)

## LD0186D2T50TR
designator *  value LD0186D2T50TR
ki_keywords: Linear Regulator 1.5A Fixed Output; ki_description: Positive, 1.5A 30V, Linear Regulator, Fixed Output 5V, TO-263; ki_fp_filters: TO?263?2*; Footprint: Package_TO_SOT_SMD:TO-263-2; Supplier: https://www.st.com/resource/en/datasheet/ld1086.pdf
footprint TO-263-2
pins: 1 ADJ/GND (in), 2 OUT (power), 3 IN (power)

## LD1086D2M33TR
designator *  value LD1086D2M33TR
ki_keywords: Linear Regulator 1.5A Fixed Output; ki_description: Positive, 1.5A 30V, Linear Regulator, Fixed Output 3.3V, TO-263; ki_fp_filters: TO?263*TabPin2*; Footprint: Package_TO_SOT_SMD:TO-263-3_TabPin2; Supplier: https://www.st.com/resource/en/datasheet/ld1086.pdf
footprint TO-263-3_TabPin2
pins: 1 ADJ/GND (in), 2 OUT (power), 3 IN (power)

## LD1086D2MTR
designator *  value LD1086D2MTR
ki_keywords: Linear Regulator 1.5A Adjustable; ki_description: Positive, 1.5A 30V, Linear Regulator, Adjustable TO-263; ki_fp_filters: TO?263*TabPin2*; Footprint: Package_TO_SOT_SMD:TO-263-3_TabPin2; Supplier: https://www.st.com/resource/en/datasheet/ld1086.pdf
footprint TO-263-3_TabPin2
pins: 1 ADJ/GND (in), 2 OUT (power), 3 IN (power)

## LD1086D2T12TR
designator *  value LD1086D2T12TR
ki_keywords: Linear Regulator 1.5A Fixed Output; ki_description: Positive, 1.5A 30V, Linear Regulator, Fixed Output 12V, TO-263; ki_fp_filters: TO?263?2*; Footprint: Package_TO_SOT_SMD:TO-263-2; Supplier: https://www.st.com/resource/en/datasheet/ld1086.pdf
footprint TO-263-2
pins: 1 ADJ/GND (in), 2 OUT (power), 3 IN (power)

## LD1086D2T18TR
designator *  value LD1086D2T18TR
ki_keywords: Linear Regulator 1.5A Fixed Output; ki_description: Positive, 1.5A 30V, Linear Regulator, Fixed Output 1.8V, TO-263; ki_fp_filters: TO?263?2*; Footprint: Package_TO_SOT_SMD:TO-263-2; Supplier: https://www.st.com/resource/en/datasheet/ld1086.pdf
footprint TO-263-2
pins: 1 ADJ/GND (in), 2 OUT (power), 3 IN (power)

## LD1086D2T33TR
designator *  value LD1086D2T33TR
ki_keywords: Linear Regulator 1.5A Fixed Output; ki_description: Positive, 1.5A 30V, Linear Regulator, Fixed Output 3.3V, TO-263; ki_fp_filters: TO?263?2*; Footprint: Package_TO_SOT_SMD:TO-263-2; Supplier: https://www.st.com/resource/en/datasheet/ld1086.pdf
footprint TO-263-2
pins: 1 ADJ/GND (in), 2 OUT (power), 3 IN (power)

## LD1086D2TTR
designator *  value LD1086D2TTR
ki_keywords: Linear Regulator 1.5A Adjustable; ki_description: Positive, 1.5A 30V, Linear Regulator, Adjustable, TO-263; ki_fp_filters: TO?263?2*; Footprint: Package_TO_SOT_SMD:TO-263-2; Supplier: https://www.st.com/resource/en/datasheet/ld1086.pdf
footprint TO-263-2
pins: 1 ADJ/GND (in), 2 OUT (power), 3 IN (power)

## LD1086DT18TR
designator *  value LD1086DT18TR
ki_keywords: Linear Regulator 1.5A Fixed Output; ki_description: Positive, 1.5A 30V, Linear Regulator, Fixed Output 1.8V, TO-252; ki_fp_filters: TO?252?2*; Footprint: Package_TO_SOT_SMD:TO-252-2; Supplier: https://www.st.com/resource/en/datasheet/ld1086.pdf
footprint TO-252-2
pins: 1 ADJ/GND (in), 2 OUT (power), 3 IN (power)

## LD1086DT25TR
designator *  value LD1086DT25TR
ki_keywords: Linear Regulator 1.5A Fixed Output; ki_description: Positive, 1.5A 30V, Linear Regulator, Fixed Output 2.5V, TO-252; ki_fp_filters: TO?252?2*; Footprint: Package_TO_SOT_SMD:TO-252-2; Supplier: https://www.st.com/resource/en/datasheet/ld1086.pdf
footprint TO-252-2
pins: 1 ADJ/GND (in), 2 OUT (power), 3 IN (power)

## LD1086DT33TR
designator *  value LD1086DT33TR
ki_keywords: Linear Regulator 1.5A Fixed Output; ki_description: Positive, 1.5A 30V, Linear Regulator, Fixed Output 3.3V, TO-252; ki_fp_filters: TO?252?2*; Footprint: Package_TO_SOT_SMD:TO-252-2; Supplier: https://www.st.com/resource/en/datasheet/ld1086.pdf
footprint TO-252-2
pins: 1 ADJ/GND (in), 2 OUT (power), 3 IN (power)
